# Altium footprint library SWLIB(150721).PcbLib: 348 footprints (part 20 of 22)
Each footprint in its own frame and in the unit in brackets; x right, y up, seen from the top. Pads: shape width x height; smd on the part's side, far side on the other; paste and mask are expansions set on the pad; w line width, h text height; cw(c..) or ccw(c..) is an arc to the next point about the centre after c.
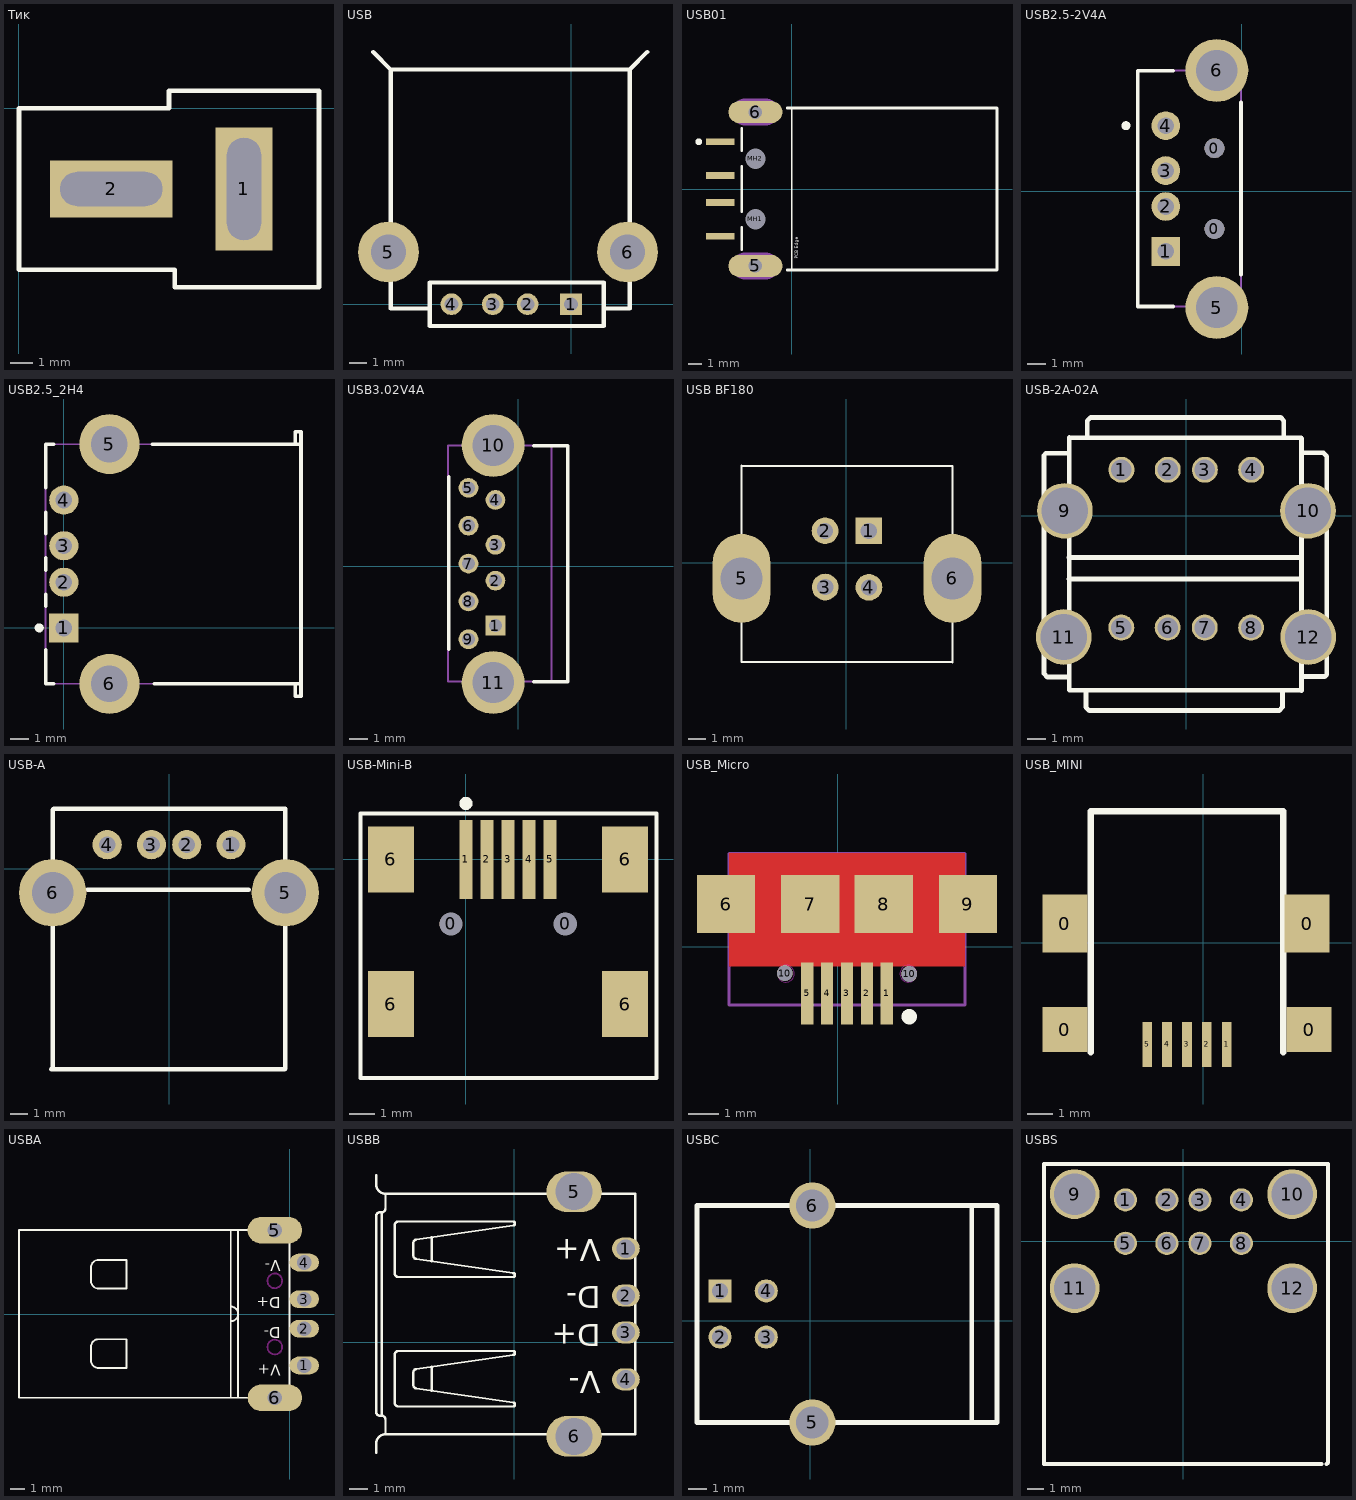
[diagram p19: the footprints below, top view; thin cyan lines are the x and y axes]

## Tͷĸ [mm]
pads (2):
  rect 2.5x5.4 hole 1.5 slot 4.5 at 90 deg: 1(9.906,-3.556)
  rect 5.4x2.5 hole 1.5 slot 4.5 at 0 deg: 2(4.064,-3.556)
Top Overlay:
  lines w0.203: 0,-7.112 0,0 6.604,0 6.604,0.762 13.208,0.762 13.208,-7.112 13.208,-7.874 6.858,-7.874 6.858,-7.112 0,-7.112

## USB [mil]
pads (6):
  rect 50x50 hole 32: 1(0,0)
  round 50 hole 32: 2(-100,0) 3(-180,0) 4(-275,0)
  round 140 hole 80: 5(-420,120) 6(130,120)
Top Overlay:
  lines w10: -455,580 -415,540 ; -325,-10 -415,-10 -415,540 ; 75,-10 135,-10 135,540 ; 175,580 135,540 ; -415,540 135,540 ; -325,-50 -325,50 75,50 75,-50 -325,-50

## USB01 [mm] "Connector; USB1.1, Type A, SM; 4 Position; Right Angle"
height 4.5
pads (8):
  rect 2.1x0.5 smd: 1(-5.3,3.5) 2(-5.3,1) 3(-5.3,-1) 4(-5.3,-3.5)
  oval 4x1.65 hole 1: 5(-2.7,-5.7) 6(-2.7,5.7)
  round 1.2 hole 1.5 unplated: MH1(-2.7,-2.25) MH2(-2.7,2.25)
Top Overlay:
  circle w0.25: c-6.9,3.5 r0.125
  lines w0.1: 0,-6 0,6
  lines w0.2: -3.7,-4.475 -3.7,-2.83 ; -3.7,-1.68 -3.7,1.68 ; -3.7,2.83 -3.7,4.475 ; -0.33,-6 15.2,-6 15.2,6 -0.33,6
  text "PCB Edge" at 0.473,-5.173 h0.25
Mechanical 1:
  lines w1: -3.45,-5.7 -1.95,-5.7 ; -3.45,5.7 -1.95,5.7
Mechanical 2:
  lines w2.016: -3.45,-5.7 -1.95,-5.7 ; -3.45,5.7 -1.95,5.7

## USB2.5-2V4A [mm] "Connector; USB1.1, Type A, Thru-Hole; 4 Position; Vertical"
height 15
pads (8):
  round 1.1 hole 1.1: 0(-1.531,-2.098) 0(-1.531,2.402)
  rect 1.6x1.6 hole 0.92: 1(-4.241,-3.348)
  round 1.6 hole 0.92: 2(-4.241,-0.848) 3(-4.241,1.152) 4(-4.241,3.652)
  round 3.5 hole 2.3: 5(-1.397,-6.477) 6(-1.397,6.731)
Top Overlay:
  circle w0.25: c-6.461,3.652 r0.125
  lines w0.2: -3.831,-6.418 -5.811,-6.418 -5.811,6.722 -3.831,6.722 ; -0.051,-4.658 -0.051,4.962
Mechanical 13:
  lines w0.1: -5.811,-6.418 -0.051,-6.418 -0.051,6.722 -5.811,6.722 -5.811,-6.418
3D body: height 12, standoff 0, extent -5.72,-6.072 -0.02,6.428

## USB2.5_2H4 [mm]
pads (6):
  rect 1.6x1.6 hole 0.92: 1(0,0)
  round 1.6 hole 0.92: 2(0,2.5) 3(0,4.5) 4(0,7)
  round 3.3 hole 2: 5(2.5,10.07) 6(2.5,-3.07)
Top Overlay:
  circle w0.25: c-1.35,0 r0.125
  lines w0.2: -1,-1.2 -1,-3.065 -0.55,-3.065 ; -1,1.2 -1,1.83 ; -1,3.17 -1,3.83 ; -1,5.17 -1,6.33 ; -1,7.67 -1,10.065 -0.55,10.065 ; 4.851,10.065 13,10.065 ; 4.953,-3.065 13,-3.065 ; 12.68,-3.065 12.68,-3.75 13,-3.75 13,10.75 12.68,10.75 12.68,10.065
Mechanical 1:
  lines w0.1: 13,-3.75 13,10.75
  text "PCB Edge" at 12.664,-2.803 h0.25
Mechanical 13:
  lines w0.1: -1,-3.065 -1,10.065 12.68,10.065 12.68,10.75 13,10.75 13,-3.75 12.68,-3.75 12.68,-3.065 -1,-3.065
3D body: height 6.5, standoff 0, extent -0.999,-3.749 12.999,10.749

## USB3.02V4A [mm] "Connector; USB1.1, Type A, Thru-Hole; 4 Position; Vertical"
height 15
pads (11):
  rect 1.1x1.1 hole 0.72: 1(-1.27,-3.302)
  round 1.1 hole 0.72: 2(-1.27,-0.802) 3(-1.27,1.198) 4(-1.27,3.698) 5(-2.769,4.369) 6(-2.769,2.261) 7(-2.769,0.152) 8(-2.769,-1.956) 9(-2.769,-4.064)
  round 3.5 hole 2.3: 10(-1.397,6.731) 11(-1.397,-6.477)
Top Overlay:
  lines w0.2: -3.861,-4.623 -3.861,4.997 ; 0.864,-6.426 2.769,-6.426 2.769,6.714 0.864,6.714
Mechanical 13:
  lines w0.1: -3.906,-6.418 -3.906,6.722 1.854,6.722 1.854,-6.418 -3.906,-6.418

## USB BF180 [mil]
pads (6):
  rect 60x60 hole 36.22: 1(51,71.6)
  round 60 hole 36.22: 2(-47.21,71.6) 3(-47,-54.69) 4(51.21,-55.4)
  oval 130x200 hole 94.49: 5(-235,-35) 6(239,-35)
Top Overlay:
  lines w5: -235,217.57 239,217.57 239,-35 239,-224.4 ; -235,218.6 -235,173.6 -235,-35 -235,-223.38 239,-223.38
3D body: height 629.92, standoff 7.87, extent -235,-225 240,217

## USB-2A-02A [mm]
pads (12):
  round 1.4 hole 1.1: 1(-3.5,2.49) 2(-1,2.49) 3(1,2.49) 4(3.5,2.49) 5(-3.505,-6.02) 6(-1.005,-6.02) 7(0.995,-6.02) 8(3.495,-6.02)
  round 3 hole 2.5: 9(-6.545,0.275) 10(6.562,0.275) 11(-6.604,-6.528) 12(6.57,-6.528)
Top Overlay:
  lines w0.254: -6.401,3.378 -7.569,3.378 -7.671,3.277 -7.671,-8.509 -7.493,-8.687 -6.308,-8.687 ; -6.325,-3.404 6.175,-3.404 ; -6.325,-2.235 6.175,-2.235 ; -6.308,-9.373 -6.308,4.227 ; -6.302,-9.398 6.198,-9.398 ; -6.299,4.216 6.201,4.216 ; -5.41,-9.398 -5.41,-10.312 -5.232,-10.49 5.004,-10.49 5.182,-10.312 5.182,-9.398 ; -5.334,4.216 -5.334,5.131 -5.156,5.309 5.08,5.309 5.258,5.131 5.258,4.216 ; 6.206,-9.409 6.206,4.191 ; 6.206,3.404 7.391,3.404 7.569,3.226 7.569,-8.56 7.468,-8.661 6.299,-8.661

## USB-A [mil]
pads (6):
  round 65 hole 37: 1(138,53.5) 2(39.5,53.5) 3(-39,53.5) 4(-137.6,53.5)
  round 150 hole 93: 5(259,-53.5) 6(-259,-53.5)
Top Overlay:
  lines w10: -182,-46.5 178,-46.5 ; -262,-446.5 258,-446.5 259,-445.5 259,-53.5 259,133.5 -257,133.5 -259,131.5 -259,-53.5 -259,-423.5 -259,-443.5 -262,-446.5

## USB-Mini-B [mil] "USB, style B-Mini, 5-contacts, SMD"
pads (11):
  round 34 hole 35: 0(-23,-98) 0(151,-98)
  rect 20x120 smd: 1(0,0) 2(32,0) 3(64,0) 4(96,0) 5(128,0)
  rect 70x100 smd: 6(-114,-220) 6(-114,0) 6(242,-220) 6(242,0)
Top Overlay:
  circle w10: c0,85 r5
  lines w6: -160,-332 290,-332 290,-327 290,70 -160,70 -160,60 -160,-332

## USB_Micro [mil]
height 224.41
pads (11):
  rect 15.75x80 smd: 1(63.18,-60) 2(37.59,-60) 3(12,-60) 4(-13.59,-60) 5(-39.18,-60)
  rect 74.8x74.8 smd: 6(-143.51,55) 7(-35.25,55) 8(59.24,55) 9(167.51,55)
  round 20 hole 20: 10(-68,-34) 10(92,-35)
Top Layer:
  pour cut-out: -139.57,-25 163.57,-25 163.57,120 -139.57,120
Top Overlay:
  circle w9.84: c92,-89.92 r4.92
Keep-Out Layer:
  circle w1: c90.74,-34.65 r10.83
  circle w1: c-66.74,-34.65 r10.83
  circle w1: c-66.74,-34.65 r10.83
  circle w1: c90.74,-34.65 r10.83
Mechanical 13:
  lines w1: -139.58,92.09 163.57,92.09
  lines w3.94: -139.57,-75 -139.58,120 163.57,120 163.57,-75 -139.57,-75
3D body "Micro USB.STP": height 106.7, standoff -9.04, extent -144.58,-75.49 169.59,138.29

## USB_MINI [mil]
pads (9):
  rect 70x70 smd: 0(-215,-135) 0(165,-135)
  rect 70x90 smd: 0(-215,30) 0(162,30)
  rect 15x70 smd: 1(37,-158) 2(6,-158) 3(-25,-158) 4(-56,-158) 5(-87,-158)
Top Overlay:
  lines w10: -175,-170 -175,205 125,205 125,-170

## USBA [mm]
pads (6):
  oval 2x1.2 hole 1: 1(0.995,-3.5) 2(0.999,-0.997) 3(0.999,1.007) 4(1.002,3.5)
  oval 3.7x1.8 hole 1: 5(-1.002,5.698) 6(-0.999,-5.698)
Top Overlay:
  lines w0.127: -4.002,-5.695 -4.002,5.705 ; -4.002,-0.495 ccw(c-4.002,0.005) -4.002,0.505 ; -3.502,-5.695 -3.502,5.705 ; -2.402,-5.695 -18.402,-5.695 -18.402,5.705 -2.402,5.705 ; -0.002,-5.205 -0.002,5.215 ; -13.502,-3.17 ccw(c-13.002,-3.17) -13.002,-3.67 -11.102,-3.67 -11.102,-1.72 -13.002,-1.72 ccw(c-13.002,-2.22) -13.502,-2.22 -13.502,-3.17 ; -13.502,2.23 ccw(c-13.002,2.23) -13.002,1.73 -11.102,1.73 -11.102,3.68 -13.002,3.68 ccw(c-13.002,3.18) -13.502,3.18 -13.502,2.23
  text "D+" at -0.59,1.401 h1.27
  text "V+" at -0.59,-3.171 h1.27
  text "V-" at -0.59,3.941 h1.27
  text "D-" at -0.59,-0.625 h1.27
Keep-Out Layer:
  circle w0.127: c-1.002,-2.245 r0.5
  circle w0.127: c-1.002,2.255 r0.5
  lines w0.127: -1.902,-6.195 cw(c-1.902,-5.695) -1.902,-5.195 -0.102,-5.195 cw(c-0.102,-5.695) -0.102,-6.195 -1.902,-6.195 ; -1.902,5.205 cw(c-1.902,5.705) -1.902,6.205 -0.102,6.205 cw(c-0.102,5.705) -0.102,5.205 -1.902,5.205

## USBB [mm]
pads (6):
  oval 1.5x1.2 hole 1: 1(6.044,5.062) 2(6.044,2.522) 3(6.044,0.522) 4(6.044,-2.018)
  oval 3x2.2 hole 2: 5(3.244,8.132) 6(3.244,-5.088)
Top Overlay:
  lines w0.127: -7.456,-5.978 -7.456,-5.478 cw(c-6.956,-5.478) -6.956,-4.978 ; -7.456,9.022 -7.456,8.522 ccw(c-6.956,8.522) -6.956,8.022 ; -4.456,-2.629 -4.456,-1.328 ; -4.456,4.371 -4.456,5.672 ; 1.744,-4.978 -6.956,-4.978 ; 1.744,8.022 -6.956,8.022 ; 4.744,-4.978 6.544,-4.978 6.544,8.022 4.744,8.022 ; -7.156,-3.978 cw(c-7.156,-4.178) -6.956,-4.178 -6.956,-4.978 ; -7.156,-3.978 -7.156,7.022 ; -7.156,-3.978 -7.256,-3.978 cw(c-7.256,-3.778) -7.456,-3.778 -7.456,6.822 cw(c-7.256,6.822) -7.256,7.022 -7.156,7.022 ; -7.156,7.022 ccw(c-7.156,7.222) -6.956,7.222 -6.956,8.022 ; -6.456,-3.278 ccw(c-6.256,-3.278) -6.256,-3.478 -0.056,-3.478 ccw(c-0.056,-3.378) 0.044,-3.378 0.044,-3.365 ccw(c-0.056,-3.365) -0.042,-3.266 -5.292,-2.508 cw(c-5.256,-2.312) -5.456,-2.312 -5.456,-1.645 cw(c-5.256,-1.645) -5.292,-1.449 -0.042,-0.691 ccw(c-0.056,-0.592) 0.044,-0.592 0.044,-0.578 ccw(c-0.056,-0.578) -0.056,-0.478 -6.256,-0.478 ccw(c-6.256,-0.678) -6.456,-0.678 -6.456,-3.278 ; -6.456,3.722 ccw(c-6.256,3.722) -6.256,3.522 -0.056,3.522 ccw(c-0.056,3.622) 0.044,3.622 0.044,3.635 ccw(c-0.056,3.635) -0.042,3.734 -5.292,4.492 cw(c-5.256,4.688) -5.456,4.688 -5.456,5.355 cw(c-5.256,5.355) -5.292,5.551 -0.042,6.309 ccw(c-0.056,6.408) 0.044,6.408 0.044,6.422 ccw(c-0.056,6.422) -0.056,6.522 -6.256,6.522 ccw(c-6.256,6.322) -6.456,6.322 -6.456,3.722
  text "D-" at 4.679,3.011 h1.2
  text "D+" at 4.679,0.979 h1.2
  text "V-" at 4.679,-1.561 h1.2
  text "V+" at 4.679,5.551 h1.2

## USBC [mil]
pads (6):
  rect 50x50 hole 35: 1(-195,65)
  round 50 hole 35: 2(-195,-35) 3(-95,-35) 4(-95,65)
  round 100 hole 70: 5(5,-220) 6(5,250)
Top Overlay:
  lines w10: -25,-220 -245,-220 -245,250 -25,250 ; 30,250 405,250 405,-220 35,-220 ; 350,-220 350,250

## USBS [mm]
pads (12):
  round 1.4 hole 1.1: 1(-3.5,2.49) 2(-1,2.49) 3(1,2.49) 4(3.5,2.49) 5(-3.5,-0.13) 6(-1,-0.13) 7(1,-0.13) 8(3.5,-0.13)
  round 3 hole 2.5: 9(-6.57,2.84) 10(6.57,2.84) 11(-6.57,-2.84) 12(6.57,-2.84)
Top Overlay:
  lines w0.254: -8.41,-13.46 8.348,-13.46 ; -7.273,-13.46 -8.416,-13.46 -8.416,4.66 8.729,4.66 8.729,-7.913 ; 8.65,-13.46 8.729,-13.381 8.729,-7.666